# Altium footprint library CONECTER.PcbLib: 120 footprints (part 1 of 8)
Each footprint in its own frame and in the unit in brackets; x right, y up, seen from the top. Pads: shape width x height; smd on the part's side, far side on the other; paste and mask are expansions set on the pad; w line width, h text height; cw(c..) or ccw(c..) is an arc to the next point about the centre after c.
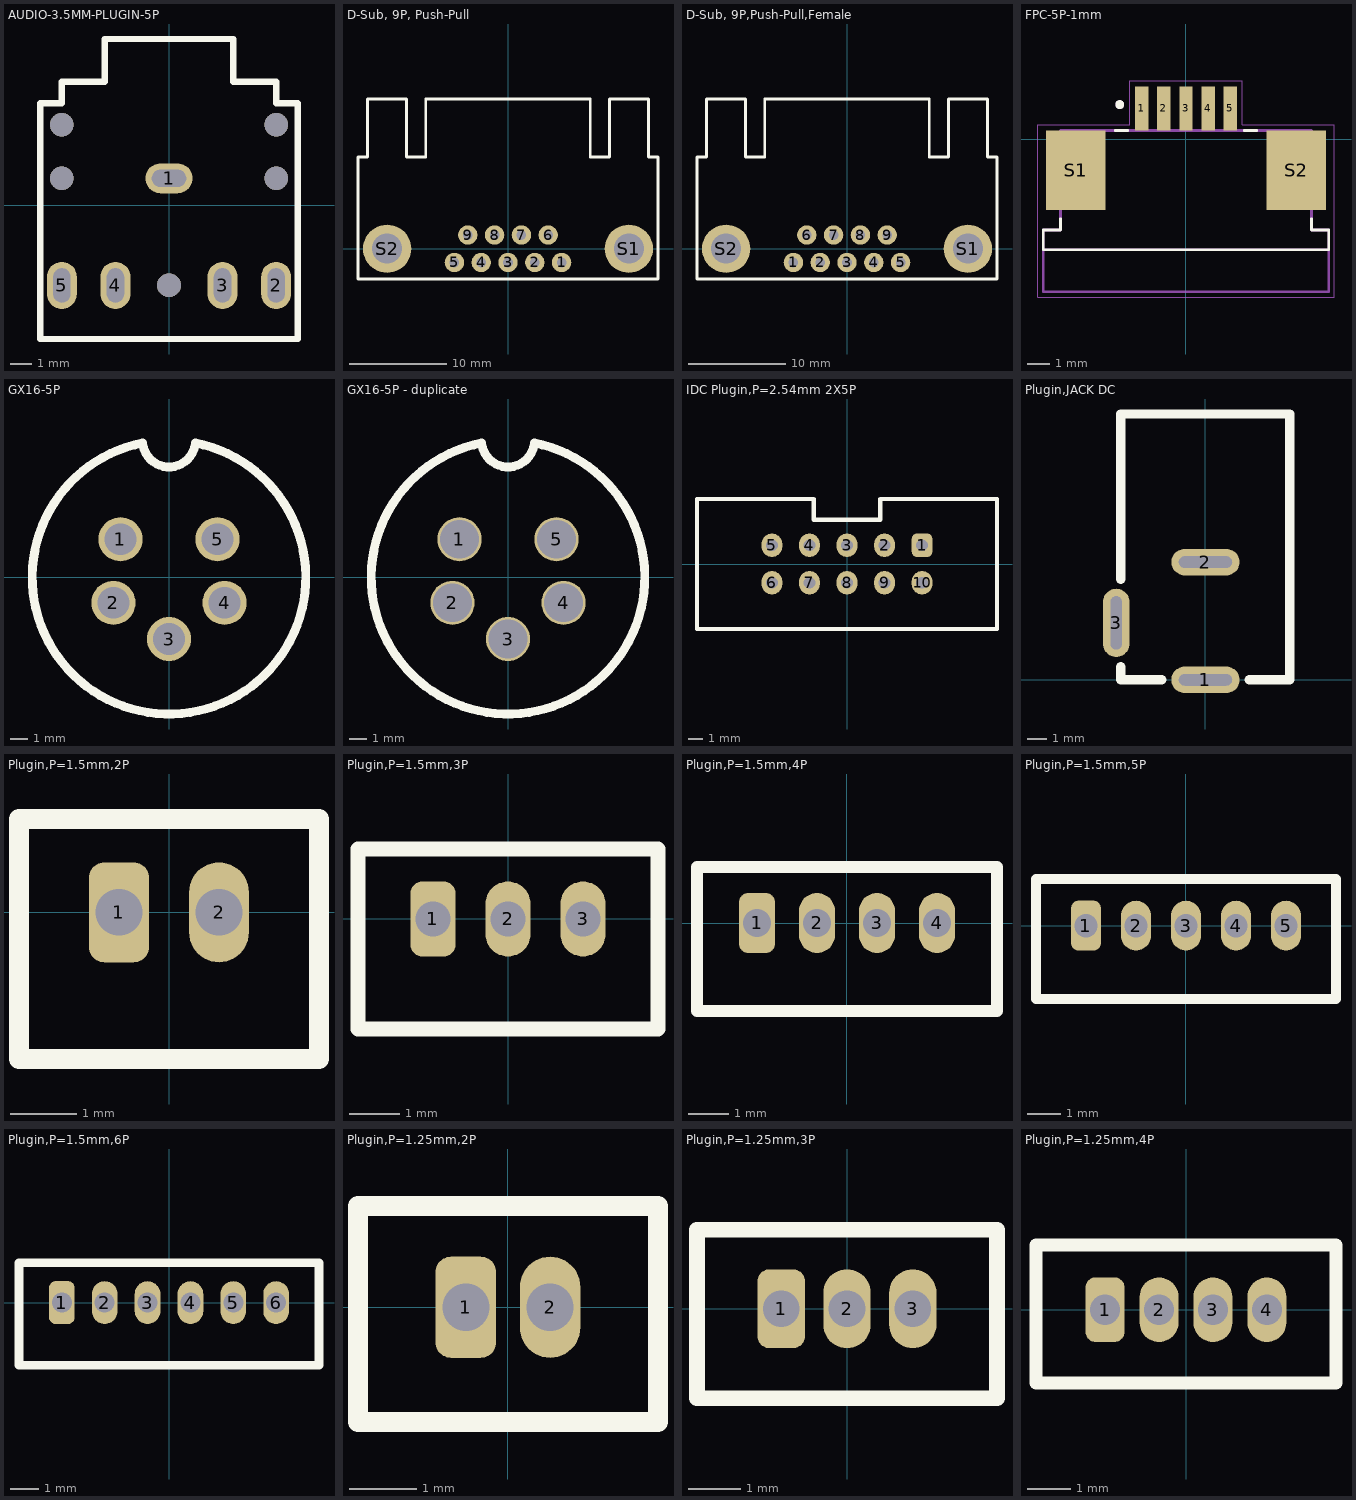
[diagram p0: the footprints below, top view; thin cyan lines are the x and y axes]

## AUDIO-3.5MM-PLUGIN-5P [mm]
pads (5):
  oval 2.2x1.4 hole 0.8 slot 1.6 at 0 deg: 1(0,1.25)
  oval 1.4x2.2 hole 0.8 slot 1.6 at 90 deg: 2(5,-3.75) 3(2.5,-3.75) 4(-2.5,-3.75) 5(-5,-3.75)
via -5,3.75 diameter 1.1 hole 1.1
via -5,1.25 diameter 1.1 hole 1.1
via 0,-3.75 diameter 1.1 hole 1.1
via 5,1.25 diameter 1.1 hole 1.1
via 5,3.75 diameter 1.1 hole 1.1
Top Overlay:
  lines w0.3: -5,5.75 -4.1,5.75 -3,5.75 -3,7.75 3,7.75 3,5.75 4.1,5.75 5,5.75 ; -5,5.75 -5,5.75 ; -5,5.75 -5,4.75 -6,4.75 -6,-6.25 6,-6.25 6,4.75 5,4.75 5,5.75 ; 5,5.75 5,5.75
3D body "CUI_DEVICES_SJ1-3525N.step": height 6.01, standoff -2.5, extent -6,-6.3 6,8

## D-Sub, 9P, Push-Pull [mm]
pads (11):
  round 2 hole 1 mask+0.2: 1(5.54,-1.42) 2(2.77,-1.42) 3(0,-1.42) 4(-2.77,-1.42) 5(-5.54,-1.42) 6(4.155,1.42) 7(1.385,1.42) 8(-1.385,1.42) 9(-4.155,1.42)
  round 5 hole 3.1 mask+0.2: S1(12.495,0) S2(-12.495,0)
Top Overlay:
  lines w0.3: -15.505,-3.12 15.505,-3.12 15.505,9.5 14.505,9.5 14.505,15.47 10.505,15.47 10.505,9.5 8.5,9.5 8.5,15.47 -8.5,15.47 -8.5,9.5 -10.505,9.5 -10.505,15.47 -14.505,15.47 -14.505,9.5 -15.505,9.5 -15.505,-3.12
3D body "DS1037-9M.STEP": height 12.5, standoff -4.4, extent -15.5,-3 15.5,15.5

## D-Sub, 9P,Push-Pull,Female [mm]
pads (11):
  round 2 hole 1 mask+0.2: 1(-5.54,-1.42) 2(-2.77,-1.42) 3(0,-1.42) 4(2.77,-1.42) 5(5.54,-1.42) 6(-4.155,1.42) 7(-1.385,1.42) 8(1.385,1.42) 9(4.155,1.42)
  round 5 hole 3.1 mask+0.2: S1(12.495,0) S2(-12.495,0)
Top Overlay:
  lines w0.3: -15.505,-3.12 15.505,-3.12 15.505,9.5 14.505,9.5 14.505,15.47 10.505,15.47 10.505,9.5 8.5,9.5 8.5,15.47 -8.5,15.47 -8.5,9.5 -10.505,9.5 -10.505,15.47 -14.505,15.47 -14.505,9.5 -15.505,9.5 -15.505,-3.12
3D body "DS1037-9F.STEP": height 12.5, standoff -4.4, extent -15.5,-2.83 15.5,15.47

## FPC-5P-1mm [mm]
pads (7):
  rect 0.61x2 smd: 1(-2,1.4) 2(-1,1.4) 3(0,1.4) 4(1,1.4) 5(2,1.4)
  rect 2.68x3.6 smd: S1(-4.99,-1.4) S2(4.99,-1.4)
Top Overlay:
  circle w0.2: c-3,1.57 r0.1
  lines w0.127: -5.675,-3.6 -5.675,-4.11 -6.46,-4.11 -6.46,-5 6.46,-5 6.46,-4.11 5.675,-4.11 5.675,-3.6 ; -3.2,0.4 -2.64,0.4 ; 2.64,0.4 3.2,0.4
3D:
  circle w0.2: c-3,1.57 r0.1
  lines w0.127: -6.46,-5 -6.46,-4.11 -5.675,-4.11 -5.675,0.4 5.675,0.4 5.675,-4.11 6.46,-4.11 6.46,-5 ; -6.46,-5 6.46,-5 ; -6.46,-5 -6.46,-6.9 6.46,-6.9 6.46,-5
Mechanical 15:
  lines w0.05: -6.71,-7.15 -6.71,0.65 -2.555,0.65 -2.555,2.65 2.555,2.65 2.555,0.65 6.71,0.65 6.71,-7.15 -6.71,-7.15
3D body "84952-5.stp": height 2.24, standoff -0.32, extent -6.465,-4.837 6.465,1.703

## GX16-5P [mm]
pads (5):
  round 2.5 hole 1.8: 1(-2.75,2.15) 2(-3.15,-1.45) 3(0,-3.5) 4(3.15,-1.45) 5(2.75,2.15)
Top Overlay:
  lines w0.5: -1.493,7.605 ccw(c0,0) 1.493,7.605 cw(c0,7.75) -1.493,7.605
3D body "GX-16 Connector 5 Pins.stp": height 19, standoff -1, extent -9.5,-10.989 9.5,10.95

## GX16-5P - duplicate [mm]
pads (5):
  round 2.5 hole 2.2: 1(-2.75,2.15) 2(-3.15,-1.45) 3(0,-3.5) 4(3.15,-1.45) 5(2.75,2.15)
Top Overlay:
  lines w0.5: -1.493,7.605 ccw(c0,7.75) 1.493,7.605 cw(c0,0) -1.493,7.605
3D body "GX-16 Connector 5 Pins.stp": height 19, standoff -1, extent -9.5,-10.989 9.5,10.95

## IDC Plugin,P=2.54mm 2X5P [mm]
pads (10):
  rrect50% 1.4x1.6 hole 0.8 mask+0.15: 1(5.08,1.27)
  oval 1.4x1.6 hole 0.8 mask+0.15: 2(2.54,1.27) 3(0,1.27) 4(-2.54,1.27) 5(-5.08,1.27) 6(-5.08,-1.27) 7(-2.54,-1.27) 8(0,-1.27) 9(2.54,-1.27) 10(5.08,-1.27)
Top Overlay:
  lines w0.3: -10.15,-4.4 -10.15,4.4 -5.075,4.4 -2.25,4.4 -2.25,3 2.25,3 2.25,4.4 5.075,4.4 10.15,4.4 10.15,-4.4 -10.15,-4.4
3D body "BH-10.STEP": height 9, standoff -3.4, extent -10.15,-4.7 10.15,4.3

## Plugin,JACK DC [mm]
pads (3):
  oval 3.6x1.4 hole 0.6 slot 2.8 at 0 deg mask+0.2: 1(0,0) 2(0,6.2)
  oval 1.4x3.6 hole 0.6 slot 2.8 at 90 deg mask+0.2: 3(-4.7,3)
Top Overlay:
  lines w0.5: -4.45,0.7 -4.45,0 -2.3,0 ; -4.45,5.3 -4.45,14 4.45,14 4.45,0 2.3,0
3D body "DC socket.STEP": height 11.5, standoff -3.5, extent -4.9,-0.3 4.5,14

## Plugin,P=1.5mm,2P [mm]
pads (2):
  rrect50% 0.9x1.5 hole 0.7: 1(-0.75,0)
  oval 0.9x1.5 hole 0.7: 2(0.75,0)
Top Overlay:
  lines w0.3: -2.25,-2.2 2.25,-2.2 2.25,1.4 -2.25,1.4 -2.25,-2.2
3D body "jst-1.5mm-2P.STEP": height 4.5, standoff -2.7, extent -2.25,-2.15 2.25,1.35

## Plugin,P=1.5mm,3P [mm]
pads (3):
  rrect50% 0.9x1.5 hole 0.7: 1(-1.5,0)
  oval 0.9x1.5 hole 0.7: 2(0,0) 3(1.5,0)
Top Overlay:
  lines w0.3: -3,-2.2 3,-2.2 3,1.4 -3,1.4 -3,-2.2
3D body "jst-1.5mm-3P.STEP": height 4.5, standoff -2.7, extent -3,-2.15 3,1.35

## Plugin,P=1.5mm,4P [mm]
pads (4):
  rrect50% 0.9x1.5 hole 0.7: 1(-2.25,0)
  oval 0.9x1.5 hole 0.7: 2(-0.75,0) 3(0.75,0) 4(2.25,0)
Top Overlay:
  lines w0.3: -3.75,-2.2 -3.75,1.4 3.75,1.4 3.75,-2.2 -3.75,-2.2
3D body "jst-1.5mm-4P.STEP": height 4.5, standoff -2.7, extent -3.75,-2.15 3.75,1.35

## Plugin,P=1.5mm,5P [mm]
pads (5):
  rrect50% 0.9x1.5 hole 0.7: 1(-3,0)
  oval 0.9x1.5 hole 0.7: 2(-1.5,0) 3(0,0) 4(1.5,0) 5(3,0)
Top Overlay:
  lines w0.3: -4.5,-2.2 -4.5,1.4 4.5,1.4 4.5,-2.2 -4.5,-2.2
3D body "jst-1.5mm-5P.STEP": height 4.5, standoff -2.7, extent -4.5,-2.15 4.5,1.35

## Plugin,P=1.5mm,6P [mm]
pads (6):
  rrect50% 0.9x1.5 hole 0.7: 1(-3.75,0)
  oval 0.9x1.5 hole 0.7: 2(-2.25,0) 3(-0.75,0) 4(0.75,0) 5(2.25,0) 6(3.75,0)
Top Overlay:
  lines w0.3: -5.25,-2.2 5.25,-2.2 5.25,1.4 -5.25,1.4 -5.25,-2.2
3D body "jst-1.5mm-6P.STEP": height 4.5, standoff -2.7, extent -5.25,-2.15 5.25,1.35

## Plugin,P=1.25mm,2P [mm]
pads (2):
  rrect50% 0.9x1.5 hole 0.7: 1(-0.625,0)
  oval 0.9x1.5 hole 0.7: 2(0.625,0)
Top Overlay:
  lines w0.3: -2.225,-1.7 2.225,-1.7 2.225,1.5 -2.225,1.5 -2.225,-1.7
3D body "1734598-2.stp": height 1.4, standoff -5, extent -2.137,-1.694 2.113,1.506

## Plugin,P=1.25mm,3P [mm]
pads (3):
  rrect50% 0.9x1.5 hole 0.7: 1(-1.25,0)
  oval 0.9x1.5 hole 0.7: 2(0,0) 3(1.25,0)
Top Overlay:
  lines w0.3: -2.85,-1.7 2.85,-1.7 2.85,1.5 -2.85,1.5 -2.85,-1.7
3D body "2-1734598-3.stp": height 4.75, standoff -2.25, extent -2.75,-1.7 2.75,1.5

## Plugin,P=1.25mm,4P [mm]
pads (4):
  rrect50% 0.9x1.5 hole 0.7: 1(-1.875,0)
  oval 0.9x1.5 hole 0.7: 2(-0.625,0) 3(0.625,0) 4(1.875,0)
Top Overlay:
  lines w0.3: -3.475,-1.7 3.475,-1.7 3.475,1.5 -3.475,1.5 ; -3.471,-1.7 -3.471,1.5
3D body "2-1734598-4.stp": height 4.75, standoff -2.25, extent -3.375,-1.7 3.375,1.5